# Altium footprint library con-samtec.PCBLIB: 805 footprints (part 40 of 55)
Each footprint in its own frame and in the unit in brackets; x right, y up, seen from the top. Pads: shape width x height; smd on the part's side, far side on the other; paste and mask are expansions set on the pad; w line width, h text height; cw(c..) or ccw(c..) is an arc to the next point about the centre after c.
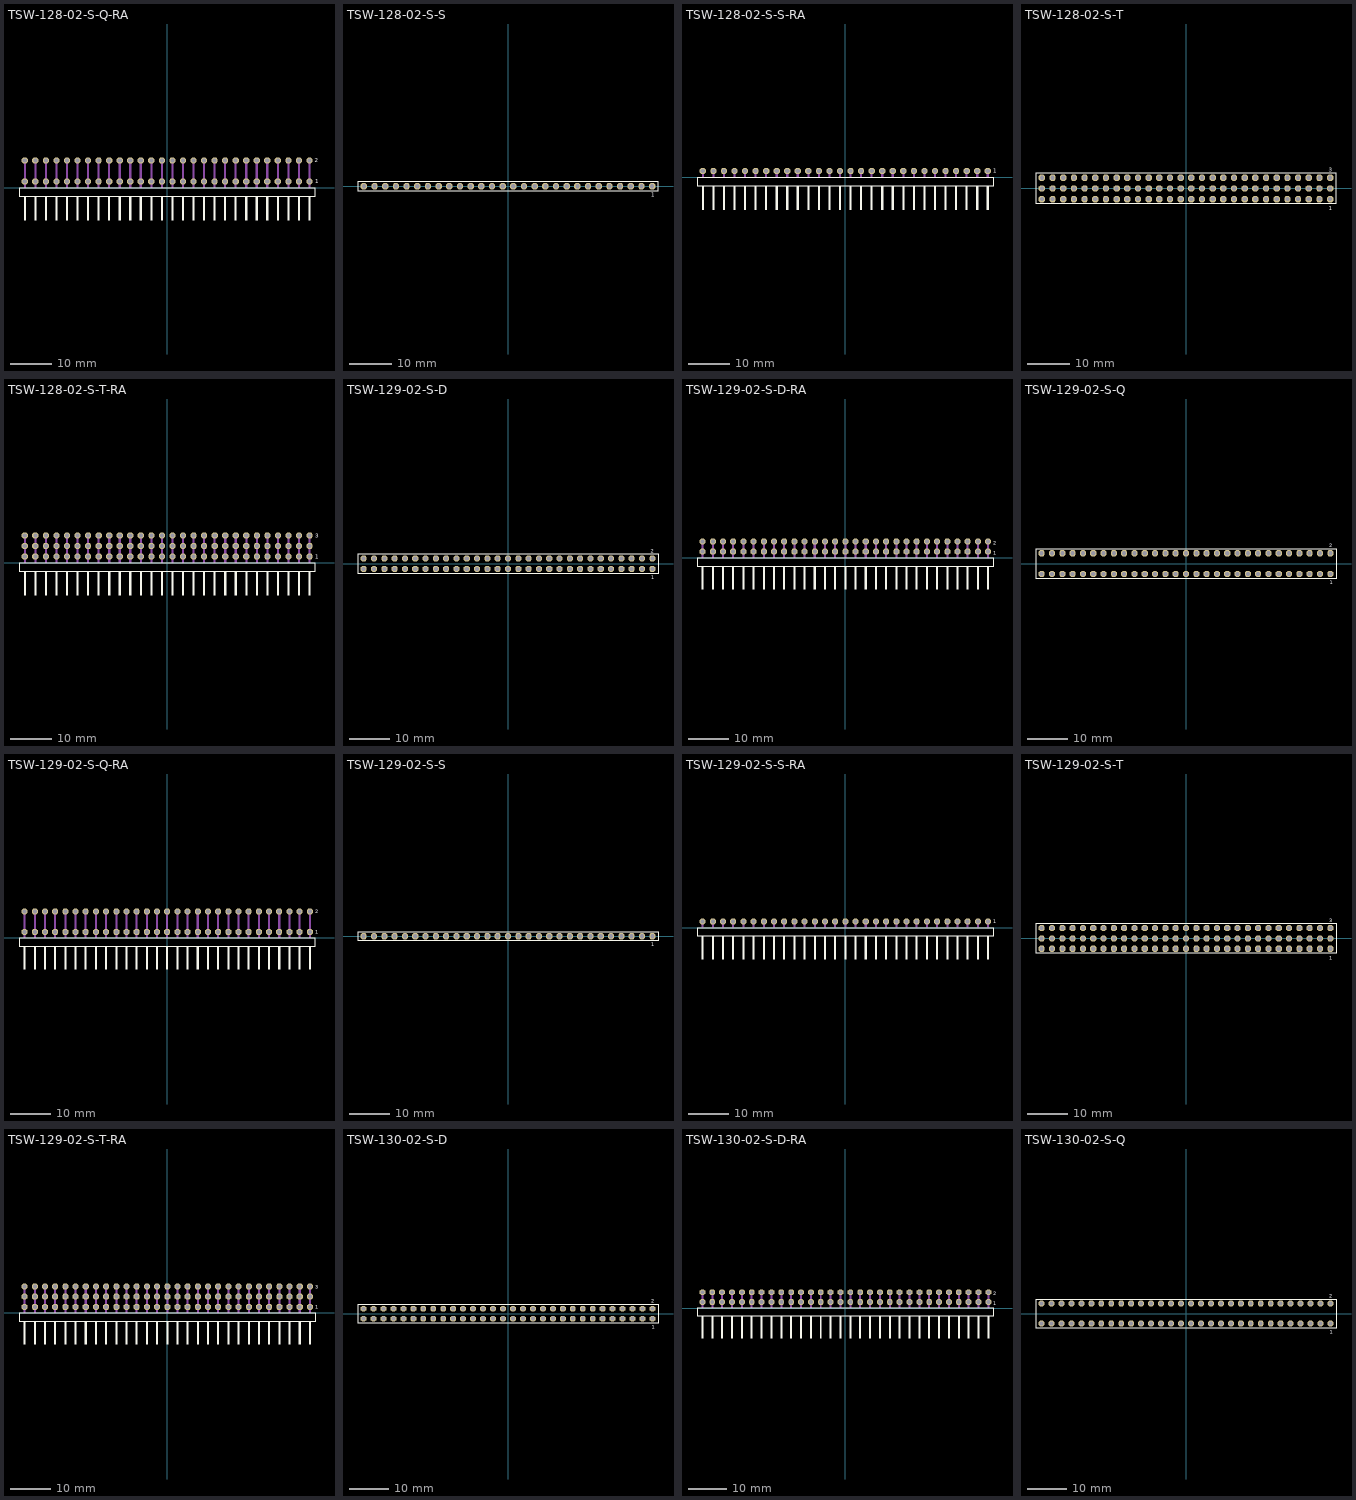
[diagram p39: the footprints below, top view; thin cyan lines are the x and y axes]

## TSW-128-02-S-Q-RA [mil]
pads (56):
  oct 59.06x59.06 hole 39.37: 1(1350,60) 2(1350,260) 3(1250,60) 4(1250,260) 5(1150,60) 6(1150,260) 7(1050,60) 8(1050,260) 9(950,60) 10(950,260) 11(850,60) 12(850,260) 13(750,60) 14(750,260) 15(650,60) 16(650,260) 17(550,60) 18(550,260) 19(450,60) 20(450,260) 21(350,60) 22(350,260) 23(250,60) 24(250,260) 25(150,60) 26(150,260) 27(50,60) 28(50,260) 29(-50,60) 30(-50,260) 31(-150,60) 32(-150,260) 33(-250,60) 34(-250,260) 35(-350,60) 36(-350,260) 37(-450,60) 38(-450,260) 39(-550,60) 40(-550,260) 41(-650,60) 42(-650,260) 43(-750,60) 44(-750,260) 45(-850,60) 46(-850,260) 47(-950,60) 48(-950,260) 49(-1050,60) 50(-1050,260) 51(-1150,60) 52(-1150,260) 53(-1250,60) 54(-1250,260) 55(-1350,60) 56(-1350,260)
Top Overlay:
  rectangle: -1360,-310.63 -1340,-80.32
  rectangle: -1260,-310.63 -1240,-80.32
  rectangle: -1160,-310.63 -1140,-80.32
  rectangle: -1060,-310.63 -1040,-80.32
  rectangle: -960,-310.63 -940,-80.32
  rectangle: -860,-310.63 -840,-80.32
  rectangle: -760,-310.63 -740,-80.32
  rectangle: -660,-310.63 -640,-80.32
  rectangle: -560,-310.63 -540,-80.32
  rectangle: -460,-310.63 -440,-80.32
  rectangle: -360,-310.63 -340,-80.32
  rectangle: -260,-310.63 -240,-80.32
  rectangle: -160,-310.63 -140,-80.32
  rectangle: -60,-310.63 -40,-80.32
  rectangle: 40,-310.63 60,-80.32
  rectangle: 140,-310.63 160,-80.32
  rectangle: 240,-310.63 260,-80.32
  rectangle: 340,-310.63 360,-80.32
  rectangle: 440,-310.63 460,-80.32
  rectangle: 540,-310.63 560,-80.32
  rectangle: 640,-310.63 660,-80.32
  rectangle: 740,-310.63 760,-80.32
  rectangle: 840,-310.63 860,-80.32
  rectangle: 940,-310.63 960,-80.32
  rectangle: 1040,-310.63 1060,-80.32
  rectangle: 1140,-310.63 1160,-80.32
  rectangle: 1240,-310.63 1260,-80.32
  rectangle: 1340,-310.63 1360,-80.32
  lines w8: -1405.08,-80.55 1405.08,-80.55 1405.08,-4.17 -1405.08,-4.17 -1405.08,-80.55
  text "1" at 1403.54,43.31 h36.81
  text "2" at 1401.18,242.72 h36.81
Mechanical 16:
  rectangle: -1360,0 -1340,270
  rectangle: -1260,0 -1240,270
  rectangle: -1160,0 -1140,270
  rectangle: -1060,0 -1040,270
  rectangle: -960,0 -940,270
  rectangle: -860,0 -840,270
  rectangle: -760,0 -740,270
  rectangle: -660,0 -640,270
  rectangle: -560,0 -540,270
  rectangle: -460,0 -440,270
  rectangle: -360,0 -340,270
  rectangle: -260,0 -240,270
  rectangle: -160,0 -140,270
  rectangle: -60,0 -40,270
  rectangle: 40,0 60,270
  rectangle: 140,0 160,270
  rectangle: 240,0 260,270
  rectangle: 340,0 360,270
  rectangle: 440,0 460,270
  rectangle: 540,0 560,270
  rectangle: 640,0 660,270
  rectangle: 740,0 760,270
  rectangle: 840,0 860,270
  rectangle: 940,0 960,270
  rectangle: 1040,0 1060,270
  rectangle: 1140,0 1160,270
  rectangle: 1240,0 1260,270
  rectangle: 1340,0 1360,270

## TSW-128-02-S-S [mm]
pads (28):
  oct 1.5x1.5 hole 1: 1(34.29,0) 2(31.75,0) 3(29.21,0) 4(26.67,0) 5(24.13,0) 6(21.59,0) 7(19.05,0) 8(16.51,0) 9(13.97,0) 10(11.43,0) 11(8.89,0) 12(6.35,0) 13(3.81,0) 14(1.27,0) 15(-1.27,0) 16(-3.81,0) 17(-6.35,0) 18(-8.89,0) 19(-11.43,0) 20(-13.97,0) 21(-16.51,0) 22(-19.05,0) 23(-21.59,0) 24(-24.13,0) 25(-26.67,0) 26(-29.21,0) 27(-31.75,0) 28(-34.29,0)
Top Overlay:
  lines w0.203: -35.689,-1.155 35.689,-1.155 35.689,1.155 -35.689,1.155 -35.689,-1.155
  text "1" at 34.032,-2.498 h0.94
Mechanical 16:
  rectangle: -34.64,-0.35 -33.94,0.35
  rectangle: -32.1,-0.35 -31.4,0.35
  rectangle: -29.56,-0.35 -28.86,0.35
  rectangle: -27.02,-0.35 -26.32,0.35
  rectangle: -24.48,-0.35 -23.78,0.35
  rectangle: -21.94,-0.35 -21.24,0.35
  rectangle: -19.4,-0.35 -18.7,0.35
  rectangle: -16.86,-0.35 -16.16,0.35
  rectangle: -14.32,-0.35 -13.62,0.35
  rectangle: -11.78,-0.35 -11.08,0.35
  rectangle: -9.24,-0.35 -8.54,0.35
  rectangle: -6.7,-0.35 -6,0.35
  rectangle: -4.16,-0.35 -3.46,0.35
  rectangle: -1.62,-0.35 -0.92,0.35
  rectangle: 0.92,-0.35 1.62,0.35
  rectangle: 3.46,-0.35 4.16,0.35
  rectangle: 6,-0.35 6.7,0.35
  rectangle: 8.54,-0.35 9.24,0.35
  rectangle: 11.08,-0.35 11.78,0.35
  rectangle: 13.62,-0.35 14.32,0.35
  rectangle: 16.16,-0.35 16.86,0.35
  rectangle: 18.7,-0.35 19.4,0.35
  rectangle: 21.24,-0.35 21.94,0.35
  rectangle: 23.78,-0.35 24.48,0.35
  rectangle: 26.32,-0.35 27.02,0.35
  rectangle: 28.86,-0.35 29.56,0.35
  rectangle: 31.4,-0.35 32.1,0.35
  rectangle: 33.94,-0.35 34.64,0.35

## TSW-128-02-S-S-RA [mil]
pads (28):
  oct 59.06x59.06 hole 39.37: 1(1350,60) 2(1250,60) 3(1150,60) 4(1050,60) 5(950,60) 6(850,60) 7(750,60) 8(650,60) 9(550,60) 10(450,60) 11(350,60) 12(250,60) 13(150,60) 14(50,60) 15(-50,60) 16(-150,60) 17(-250,60) 18(-350,60) 19(-450,60) 20(-550,60) 21(-650,60) 22(-750,60) 23(-850,60) 24(-950,60) 25(-1050,60) 26(-1150,60) 27(-1250,60) 28(-1350,60)
Top Overlay:
  rectangle: -1360,-310.63 -1340,-80.32
  rectangle: -1260,-310.63 -1240,-80.32
  rectangle: -1160,-310.63 -1140,-80.32
  rectangle: -1060,-310.63 -1040,-80.32
  rectangle: -960,-310.63 -940,-80.32
  rectangle: -860,-310.63 -840,-80.32
  rectangle: -760,-310.63 -740,-80.32
  rectangle: -660,-310.63 -640,-80.32
  rectangle: -560,-310.63 -540,-80.32
  rectangle: -460,-310.63 -440,-80.32
  rectangle: -360,-310.63 -340,-80.32
  rectangle: -260,-310.63 -240,-80.32
  rectangle: -160,-310.63 -140,-80.32
  rectangle: -60,-310.63 -40,-80.32
  rectangle: 40,-310.63 60,-80.32
  rectangle: 140,-310.63 160,-80.32
  rectangle: 240,-310.63 260,-80.32
  rectangle: 340,-310.63 360,-80.32
  rectangle: 440,-310.63 460,-80.32
  rectangle: 540,-310.63 560,-80.32
  rectangle: 640,-310.63 660,-80.32
  rectangle: 740,-310.63 760,-80.32
  rectangle: 840,-310.63 860,-80.32
  rectangle: 940,-310.63 960,-80.32
  rectangle: 1040,-310.63 1060,-80.32
  rectangle: 1140,-310.63 1160,-80.32
  rectangle: 1240,-310.63 1260,-80.32
  rectangle: 1340,-310.63 1360,-80.32
  lines w8: -1405.08,-80.55 1405.08,-80.55 1405.08,-4.17 -1405.08,-4.17 -1405.08,-80.55
  text "1" at 1400.47,45.35 h36.81
Mechanical 16:
  rectangle: -1360,0 -1340,70
  rectangle: -1260,0 -1240,70
  rectangle: -1160,0 -1140,70
  rectangle: -1060,0 -1040,70
  rectangle: -960,0 -940,70
  rectangle: -860,0 -840,70
  rectangle: -760,0 -740,70
  rectangle: -660,0 -640,70
  rectangle: -560,0 -540,70
  rectangle: -460,0 -440,70
  rectangle: -360,0 -340,70
  rectangle: -260,0 -240,70
  rectangle: -160,0 -140,70
  rectangle: -60,0 -40,70
  rectangle: 40,0 60,70
  rectangle: 140,0 160,70
  rectangle: 240,0 260,70
  rectangle: 340,0 360,70
  rectangle: 440,0 460,70
  rectangle: 540,0 560,70
  rectangle: 640,0 660,70
  rectangle: 740,0 760,70
  rectangle: 840,0 860,70
  rectangle: 940,0 960,70
  rectangle: 1040,0 1060,70
  rectangle: 1140,0 1160,70
  rectangle: 1240,0 1260,70
  rectangle: 1340,0 1360,70

## TSW-128-02-S-T [mm]
pads (84):
  oct 1.5x1.5 hole 1: 1(34.29,-2.54) 2(34.29,0) 3(34.29,2.54) 4(31.75,-2.54) 5(31.75,0) 6(31.75,2.54) 7(29.21,-2.54) 8(29.21,0) 9(29.21,2.54) 10(26.67,-2.54) 11(26.67,0) 12(26.67,2.54) 13(24.13,-2.54) 14(24.13,0) 15(24.13,2.54) 16(21.59,-2.54) 17(21.59,0) 18(21.59,2.54) 19(19.05,-2.54) 20(19.05,0) 21(19.05,2.54) 22(16.51,-2.54) 23(16.51,0) 24(16.51,2.54) 25(13.97,-2.54) 26(13.97,0) 27(13.97,2.54) 28(11.43,-2.54) 29(11.43,0) 30(11.43,2.54) 31(8.89,-2.54) 32(8.89,0) 33(8.89,2.54) 34(6.35,-2.54) 35(6.35,0) 36(6.35,2.54) 37(3.81,-2.54) 38(3.81,0) 39(3.81,2.54) 40(1.27,-2.54) 41(1.27,0) 42(1.27,2.54) 43(-1.27,-2.54) 44(-1.27,0) 45(-1.27,2.54) 46(-3.81,-2.54) 47(-3.81,0) 48(-3.81,2.54) 49(-6.35,-2.54) 50(-6.35,0) 51(-6.35,2.54) 52(-8.89,-2.54) 53(-8.89,0) 54(-8.89,2.54) 55(-11.43,-2.54) 56(-11.43,0) 57(-11.43,2.54) 58(-13.97,-2.54) 59(-13.97,0) 60(-13.97,2.54) 61(-16.51,-2.54) 62(-16.51,0) 63(-16.51,2.54) 64(-19.05,-2.54) 65(-19.05,0) 66(-19.05,2.54) 67(-21.59,-2.54) 68(-21.59,0) 69(-21.59,2.54) 70(-24.13,-2.54) 71(-24.13,0) 72(-24.13,2.54) 73(-26.67,-2.54) 74(-26.67,0) 75(-26.67,2.54) 76(-29.21,-2.54) 77(-29.21,0) 78(-29.21,2.54) 79(-31.75,-2.54) 80(-31.75,0) 81(-31.75,2.54) 82(-34.29,-2.54) 83(-34.29,0) 84(-34.29,2.54)
Top Overlay:
  lines w0.203: -35.689,-3.695 35.689,-3.695 35.689,3.695 -35.689,3.695 -35.689,-3.695
  text "1" at 33.982,-5.188 h0.94
  text "3" at 33.978,3.989 h0.94
Mechanical 16:
  rectangle: -34.64,-2.89 -33.94,-2.19
  rectangle: -34.64,-0.35 -33.94,0.35
  rectangle: -34.64,2.19 -33.94,2.89
  rectangle: -32.1,-2.89 -31.4,-2.19
  rectangle: -32.1,-0.35 -31.4,0.35
  rectangle: -32.1,2.19 -31.4,2.89
  rectangle: -29.56,-2.89 -28.86,-2.19
  rectangle: -29.56,-0.35 -28.86,0.35
  rectangle: -29.56,2.19 -28.86,2.89
  rectangle: -27.02,-2.89 -26.32,-2.19
  rectangle: -27.02,-0.35 -26.32,0.35
  rectangle: -27.02,2.19 -26.32,2.89
  rectangle: -24.48,-2.89 -23.78,-2.19
  rectangle: -24.48,-0.35 -23.78,0.35
  rectangle: -24.48,2.19 -23.78,2.89
  rectangle: -21.94,-2.89 -21.24,-2.19
  rectangle: -21.94,-0.35 -21.24,0.35
  rectangle: -21.94,2.19 -21.24,2.89
  rectangle: -19.4,-2.89 -18.7,-2.19
  rectangle: -19.4,-0.35 -18.7,0.35
  rectangle: -19.4,2.19 -18.7,2.89
  rectangle: -16.86,-2.89 -16.16,-2.19
  rectangle: -16.86,-0.35 -16.16,0.35
  rectangle: -16.86,2.19 -16.16,2.89
  rectangle: -14.32,-2.89 -13.62,-2.19
  rectangle: -14.32,-0.35 -13.62,0.35
  rectangle: -14.32,2.19 -13.62,2.89
  rectangle: -11.78,-2.89 -11.08,-2.19
  rectangle: -11.78,-0.35 -11.08,0.35
  rectangle: -11.78,2.19 -11.08,2.89
  rectangle: -9.24,-2.89 -8.54,-2.19
  rectangle: -9.24,-0.35 -8.54,0.35
  rectangle: -9.24,2.19 -8.54,2.89
  rectangle: -6.7,-2.89 -6,-2.19
  rectangle: -6.7,-0.35 -6,0.35
  rectangle: -6.7,2.19 -6,2.89
  rectangle: -4.16,-2.89 -3.46,-2.19
  rectangle: -4.16,-0.35 -3.46,0.35
  rectangle: -4.16,2.19 -3.46,2.89
  rectangle: -1.62,-2.89 -0.92,-2.19
  rectangle: -1.62,-0.35 -0.92,0.35
  rectangle: -1.62,2.19 -0.92,2.89
  rectangle: 0.92,-2.89 1.62,-2.19
  rectangle: 0.92,-0.35 1.62,0.35
  rectangle: 0.92,2.19 1.62,2.89
  rectangle: 3.46,-2.89 4.16,-2.19
  rectangle: 3.46,-0.35 4.16,0.35
  rectangle: 3.46,2.19 4.16,2.89
  rectangle: 6,-2.89 6.7,-2.19
  rectangle: 6,-0.35 6.7,0.35
  rectangle: 6,2.19 6.7,2.89
  rectangle: 8.54,-2.89 9.24,-2.19
  rectangle: 8.54,-0.35 9.24,0.35
  rectangle: 8.54,2.19 9.24,2.89
  rectangle: 11.08,-2.89 11.78,-2.19
  rectangle: 11.08,-0.35 11.78,0.35
  rectangle: 11.08,2.19 11.78,2.89
  rectangle: 13.62,-2.89 14.32,-2.19
  rectangle: 13.62,-0.35 14.32,0.35
  rectangle: 13.62,2.19 14.32,2.89
  rectangle: 16.16,-2.89 16.86,-2.19
  rectangle: 16.16,-0.35 16.86,0.35
  rectangle: 16.16,2.19 16.86,2.89
  rectangle: 18.7,-2.89 19.4,-2.19
  rectangle: 18.7,-0.35 19.4,0.35
  rectangle: 18.7,2.19 19.4,2.89
  rectangle: 21.24,-2.89 21.94,-2.19
  rectangle: 21.24,-0.35 21.94,0.35
  rectangle: 21.24,2.19 21.94,2.89
  rectangle: 23.78,-2.89 24.48,-2.19
  rectangle: 23.78,-0.35 24.48,0.35
  rectangle: 23.78,2.19 24.48,2.89
  rectangle: 26.32,-2.89 27.02,-2.19
  rectangle: 26.32,-0.35 27.02,0.35
  rectangle: 26.32,2.19 27.02,2.89
  rectangle: 28.86,-2.89 29.56,-2.19
  rectangle: 28.86,-0.35 29.56,0.35
  rectangle: 28.86,2.19 29.56,2.89
  rectangle: 31.4,-2.89 32.1,-2.19
  rectangle: 31.4,-0.35 32.1,0.35
  rectangle: 31.4,2.19 32.1,2.89
  rectangle: 33.94,-2.89 34.64,-2.19
  rectangle: 33.94,-0.35 34.64,0.35
  rectangle: 33.94,2.19 34.64,2.89

## TSW-128-02-S-T-RA [mil]
pads (84):
  oct 59.06x59.06 hole 39.37: 1(1350,60) 2(1350,160) 3(1350,260) 4(1250,60) 5(1250,160) 6(1250,260) 7(1150,60) 8(1150,160) 9(1150,260) 10(1050,60) 11(1050,160) 12(1050,260) 13(950,60) 14(950,160) 15(950,260) 16(850,60) 17(850,160) 18(850,260) 19(750,60) 20(750,160) 21(750,260) 22(650,60) 23(650,160) 24(650,260) 25(550,60) 26(550,160) 27(550,260) 28(450,60) 29(450,160) 30(450,260) 31(350,60) 32(350,160) 33(350,260) 34(250,60) 35(250,160) 36(250,260) 37(150,60) 38(150,160) 39(150,260) 40(50,60) 41(50,160) 42(50,260) 43(-50,60) 44(-50,160) 45(-50,260) 46(-150,60) 47(-150,160) 48(-150,260) 49(-250,60) 50(-250,160) 51(-250,260) 52(-350,60) 53(-350,160) 54(-350,260) 55(-450,60) 56(-450,160) 57(-450,260) 58(-550,60) 59(-550,160) 60(-550,260) 61(-650,60) 62(-650,160) 63(-650,260) 64(-750,60) 65(-750,160) 66(-750,260) 67(-850,60) 68(-850,160) 69(-850,260) 70(-950,60) 71(-950,160) 72(-950,260) 73(-1050,60) 74(-1050,160) 75(-1050,260) 76(-1150,60) 77(-1150,160) 78(-1150,260) 79(-1250,60) 80(-1250,160) 81(-1250,260) 82(-1350,60) 83(-1350,160) 84(-1350,260)
Top Overlay:
  rectangle: -1360,-310.63 -1340,-80.32
  rectangle: -1260,-310.63 -1240,-80.32
  rectangle: -1160,-310.63 -1140,-80.32
  rectangle: -1060,-310.63 -1040,-80.32
  rectangle: -960,-310.63 -940,-80.32
  rectangle: -860,-310.63 -840,-80.32
  rectangle: -760,-310.63 -740,-80.32
  rectangle: -660,-310.63 -640,-80.32
  rectangle: -560,-310.63 -540,-80.32
  rectangle: -460,-310.63 -440,-80.32
  rectangle: -360,-310.63 -340,-80.32
  rectangle: -260,-310.63 -240,-80.32
  rectangle: -160,-310.63 -140,-80.32
  rectangle: -60,-310.63 -40,-80.32
  rectangle: 40,-310.63 60,-80.32
  rectangle: 140,-310.63 160,-80.32
  rectangle: 240,-310.63 260,-80.32
  rectangle: 340,-310.63 360,-80.32
  rectangle: 440,-310.63 460,-80.32
  rectangle: 540,-310.63 560,-80.32
  rectangle: 640,-310.63 660,-80.32
  rectangle: 740,-310.63 760,-80.32
  rectangle: 840,-310.63 860,-80.32
  rectangle: 940,-310.63 960,-80.32
  rectangle: 1040,-310.63 1060,-80.32
  rectangle: 1140,-310.63 1160,-80.32
  rectangle: 1240,-310.63 1260,-80.32
  rectangle: 1340,-310.63 1360,-80.32
  lines w8: -1405.08,-80.55 1405.08,-80.55 1405.08,-4.17 -1405.08,-4.17 -1405.08,-80.55
  text "1" at 1401.57,41.34 h36.81
  text "3" at 1402.17,236.81 h36.81
Mechanical 16:
  rectangle: -1360,0 -1340,270
  rectangle: -1260,0 -1240,270
  rectangle: -1160,0 -1140,270
  rectangle: -1060,0 -1040,270
  rectangle: -960,0 -940,270
  rectangle: -860,0 -840,270
  rectangle: -760,0 -740,270
  rectangle: -660,0 -640,270
  rectangle: -560,0 -540,270
  rectangle: -460,0 -440,270
  rectangle: -360,0 -340,270
  rectangle: -260,0 -240,270
  rectangle: -160,0 -140,270
  rectangle: -60,0 -40,270
  rectangle: 40,0 60,270
  rectangle: 140,0 160,270
  rectangle: 240,0 260,270
  rectangle: 340,0 360,270
  rectangle: 440,0 460,270
  rectangle: 540,0 560,270
  rectangle: 640,0 660,270
  rectangle: 740,0 760,270
  rectangle: 840,0 860,270
  rectangle: 940,0 960,270
  rectangle: 1040,0 1060,270
  rectangle: 1140,0 1160,270
  rectangle: 1240,0 1260,270
  rectangle: 1340,0 1360,270

## TSW-129-02-S-D [mm]
pads (58):
  oct 1.5x1.5 hole 1: 1(35.56,-1.27) 2(35.56,1.27) 3(33.02,-1.27) 4(33.02,1.27) 5(30.48,-1.27) 6(30.48,1.27) 7(27.94,-1.27) 8(27.94,1.27) 9(25.4,-1.27) 10(25.4,1.27) 11(22.86,-1.27) 12(22.86,1.27) 13(20.32,-1.27) 14(20.32,1.27) 15(17.78,-1.27) 16(17.78,1.27) 17(15.24,-1.27) 18(15.24,1.27) 19(12.7,-1.27) 20(12.7,1.27) 21(10.16,-1.27) 22(10.16,1.27) 23(7.62,-1.27) 24(7.62,1.27) 25(5.08,-1.27) 26(5.08,1.27) 27(2.54,-1.27) 28(2.54,1.27) 29(0,-1.27) 30(0,1.27) 31(-2.54,-1.27) 32(-2.54,1.27) 33(-5.08,-1.27) 34(-5.08,1.27) 35(-7.62,-1.27) 36(-7.62,1.27) 37(-10.16,-1.27) 38(-10.16,1.27) 39(-12.7,-1.27) 40(-12.7,1.27) 41(-15.24,-1.27) 42(-15.24,1.27) 43(-17.78,-1.27) 44(-17.78,1.27) 45(-20.32,-1.27) 46(-20.32,1.27) 47(-22.86,-1.27) 48(-22.86,1.27) 49(-25.4,-1.27) 50(-25.4,1.27) 51(-27.94,-1.27) 52(-27.94,1.27) 53(-30.48,-1.27) 54(-30.48,1.27) 55(-33.02,-1.27) 56(-33.02,1.27) 57(-35.56,-1.27) 58(-35.56,1.27)
Top Overlay:
  lines w0.203: -36.959,-2.425 36.959,-2.425 36.959,2.425 -36.959,2.425 -36.959,-2.425
  text "1" at 35.352,-3.818 h0.94
  text "2" at 35.177,2.744 h0.94
Mechanical 16:
  rectangle: -35.91,-1.62 -35.21,-0.92
  rectangle: -35.91,0.92 -35.21,1.62
  rectangle: -33.37,-1.62 -32.67,-0.92
  rectangle: -33.37,0.92 -32.67,1.62
  rectangle: -30.83,-1.62 -30.13,-0.92
  rectangle: -30.83,0.92 -30.13,1.62
  rectangle: -28.29,-1.62 -27.59,-0.92
  rectangle: -28.29,0.92 -27.59,1.62
  rectangle: -25.75,-1.62 -25.05,-0.92
  rectangle: -25.75,0.92 -25.05,1.62
  rectangle: -23.21,-1.62 -22.51,-0.92
  rectangle: -23.21,0.92 -22.51,1.62
  rectangle: -20.67,-1.62 -19.97,-0.92
  rectangle: -20.67,0.92 -19.97,1.62
  rectangle: -18.13,-1.62 -17.43,-0.92
  rectangle: -18.13,0.92 -17.43,1.62
  rectangle: -15.59,-1.62 -14.89,-0.92
  rectangle: -15.59,0.92 -14.89,1.62
  rectangle: -13.05,-1.62 -12.35,-0.92
  rectangle: -13.05,0.92 -12.35,1.62
  rectangle: -10.51,-1.62 -9.81,-0.92
  rectangle: -10.51,0.92 -9.81,1.62
  rectangle: -7.97,-1.62 -7.27,-0.92
  rectangle: -7.97,0.92 -7.27,1.62
  rectangle: -5.43,-1.62 -4.73,-0.92
  rectangle: -5.43,0.92 -4.73,1.62
  rectangle: -2.89,-1.62 -2.19,-0.92
  rectangle: -2.89,0.92 -2.19,1.62
  rectangle: -0.35,-1.62 0.35,-0.92
  rectangle: -0.35,0.92 0.35,1.62
  rectangle: 2.19,-1.62 2.89,-0.92
  rectangle: 2.19,0.92 2.89,1.62
  rectangle: 4.73,-1.62 5.43,-0.92
  rectangle: 4.73,0.92 5.43,1.62
  rectangle: 7.27,-1.62 7.97,-0.92
  rectangle: 7.27,0.92 7.97,1.62
  rectangle: 9.81,-1.62 10.51,-0.92
  rectangle: 9.81,0.92 10.51,1.62
  rectangle: 12.35,-1.62 13.05,-0.92
  rectangle: 12.35,0.92 13.05,1.62
  rectangle: 14.89,-1.62 15.59,-0.92
  rectangle: 14.89,0.92 15.59,1.62
  rectangle: 17.43,-1.62 18.13,-0.92
  rectangle: 17.43,0.92 18.13,1.62
  rectangle: 19.97,-1.62 20.67,-0.92
  rectangle: 19.97,0.92 20.67,1.62
  rectangle: 22.51,-1.62 23.21,-0.92
  rectangle: 22.51,0.92 23.21,1.62
  rectangle: 25.05,-1.62 25.75,-0.92
  rectangle: 25.05,0.92 25.75,1.62
  rectangle: 27.59,-1.62 28.29,-0.92
  rectangle: 27.59,0.92 28.29,1.62
  rectangle: 30.13,-1.62 30.83,-0.92
  rectangle: 30.13,0.92 30.83,1.62
  rectangle: 32.67,-1.62 33.37,-0.92
  rectangle: 32.67,0.92 33.37,1.62
  rectangle: 35.21,-1.62 35.91,-0.92
  rectangle: 35.21,0.92 35.91,1.62

## TSW-129-02-S-D-RA [mil]
pads (58):
  oct 59.06x59.06 hole 39.37: 1(1400,60) 2(1400,160) 3(1300,60) 4(1300,160) 5(1200,60) 6(1200,160) 7(1100,60) 8(1100,160) 9(1000,60) 10(1000,160) 11(900,60) 12(900,160) 13(800,60) 14(800,160) 15(700,60) 16(700,160) 17(600,60) 18(600,160) 19(500,60) 20(500,160) 21(400,60) 22(400,160) 23(300,60) 24(300,160) 25(200,60) 26(200,160) 27(100,60) 28(100,160) 29(0,60) 30(0,160) 31(-100,60) 32(-100,160) 33(-200,60) 34(-200,160) 35(-300,60) 36(-300,160) 37(-400,60) 38(-400,160) 39(-500,60) 40(-500,160) 41(-600,60) 42(-600,160) 43(-700,60) 44(-700,160) 45(-800,60) 46(-800,160) 47(-900,60) 48(-900,160) 49(-1000,60) 50(-1000,160) 51(-1100,60) 52(-1100,160) 53(-1200,60) 54(-1200,160) 55(-1300,60) 56(-1300,160) 57(-1400,60) 58(-1400,160)
Top Overlay:
  rectangle: -1410,-310.63 -1390,-80.32
  rectangle: -1310,-310.63 -1290,-80.32
  rectangle: -1210,-310.63 -1190,-80.32
  rectangle: -1110,-310.63 -1090,-80.32
  rectangle: -1010,-310.63 -990,-80.32
  rectangle: -910,-310.63 -890,-80.32
  rectangle: -810,-310.63 -790,-80.32
  rectangle: -710,-310.63 -690,-80.32
  rectangle: -610,-310.63 -590,-80.32
  rectangle: -510,-310.63 -490,-80.32
  rectangle: -410,-310.63 -390,-80.32
  rectangle: -310,-310.63 -290,-80.32
  rectangle: -210,-310.63 -190,-80.32
  rectangle: -110,-310.63 -90,-80.32
  rectangle: -10,-310.63 10,-80.32
  rectangle: 90,-310.63 110,-80.32
  rectangle: 190,-310.63 210,-80.32
  rectangle: 290,-310.63 310,-80.32
  rectangle: 390,-310.63 410,-80.32
  rectangle: 490,-310.63 510,-80.32
  rectangle: 590,-310.63 610,-80.32
  rectangle: 690,-310.63 710,-80.32
  rectangle: 790,-310.63 810,-80.32
  rectangle: 890,-310.63 910,-80.32
  rectangle: 990,-310.63 1010,-80.32
  rectangle: 1090,-310.63 1110,-80.32
  rectangle: 1190,-310.63 1210,-80.32
  rectangle: 1290,-310.63 1310,-80.32
  rectangle: 1390,-310.63 1410,-80.32
  lines w8: -1455.08,-80.55 1455.08,-80.55 1455.08,-4.17 -1455.08,-4.17 -1455.08,-80.55
  text "1" at 1450.59,30.51 h36.81
  text "2" at 1449.21,129.53 h36.81
Mechanical 16:
  rectangle: -1410,0 -1390,170
  rectangle: -1310,0 -1290,170
  rectangle: -1210,0 -1190,170
  rectangle: -1110,0 -1090,170
  rectangle: -1010,0 -990,170
  rectangle: -910,0 -890,170
  rectangle: -810,0 -790,170
  rectangle: -710,0 -690,170
  rectangle: -610,0 -590,170
  rectangle: -510,0 -490,170
  rectangle: -410,0 -390,170
  rectangle: -310,0 -290,170
  rectangle: -210,0 -190,170
  rectangle: -110,0 -90,170
  rectangle: -10,0 10,170
  rectangle: 90,0 110,170
  rectangle: 190,0 210,170
  rectangle: 290,0 310,170
  rectangle: 390,0 410,170
  rectangle: 490,0 510,170
  rectangle: 590,0 610,170
  rectangle: 690,0 710,170
  rectangle: 790,0 810,170
  rectangle: 890,0 910,170
  rectangle: 990,0 1010,170
  rectangle: 1090,0 1110,170
  rectangle: 1190,0 1210,170
  rectangle: 1290,0 1310,170
  rectangle: 1390,0 1410,170
